# Altium schematic symbol library Analog Devices Data Converters Digital-to-Analog Converters.SchLib: 2231 symbols (part 112 of 135) (continued)
## AD9706BCPZ (continued)

## AD9706BCPZRL7
designator U?
Single 12-Bit TxDAC, -40 to +85 degC, CP-32-2, Pb-Free, Reel; Generic Part Number: AD9706; Manufacturer: Analog Devices; PartNumber: AD9706BCPZRL7; # DAC Outputs: 1; Max V+: 3.6V; Op Pwr Diss: 57mW; Resolution (Bits): 12; Settling Time: 11ns; Single Supply: Yes; DatasheetVersion: Rev.B; PackageVersion: Jan-2005; PackageReference: CP-32-2; PackageDescription: 32-Lead Lead Frame Chip Scale Package [LFCSP_VQ] 5 x 5 mm Body, Very Thin Quad; Supplier 1: Digi-Key; Supplier Part Number 1: AD9706BCPZRL7-ND; Supplier 2: Mouser; Supplier Part Number 2: 584-AD9706BCPZR7; Packing: Reel; RoHS: Y; Mounting Technology: Surface Mount; Code_JEDEC: MO-220-VHHD-2; ComponentLink1Description: Manufacturer URL; ComponentLink1URL: http://www.analog.com/en/index.html; ComponentLink2Description: Datasheet; ComponentLink2URL: http://www.analog.com/static/imported-files/data_sheets/AD9704_9705_9706_9707.pdf; ComponentLink3Description: Package Specification; ComponentLink3URL: http://www.analog.com/static/imported-files/packages/414143737956480539664569CP_32_2.pdf; ComponentLink4Description: Product URL; ComponentLink4URL: http://www.analog.com/en/digital-to-analog-converters/da-converters/ad9707/products/product.html
footprint CP-32-2_N (QFN, 32-Leads, Body 5x5mm, Pitch 0.5mm, Thermal Pad 3.1x3.1mm, IPC Medium Density)
footprint CP-32-2_L (QFN, 32-Leads, Body 5x5mm, Pitch 0.5mm, Thermal Pad 3.1x3.1mm, IPC High Density)
footprint CP-32-2_M (QFN, 32-Leads, Body 5x5mm, Pitch 0.5mm, Thermal Pad 3.1x3.1mm, IPC Low Density)
pins: 1 DB5 (in) "Data Bit 5.", 2 DB4 (in) "Data Bit 4.", 3 DVDD (power) "Digital Supply Voltage (1.7 V to 3.6 V).", 4 DB3 (in) "Data Bit 3.", 5 DB2 (in) "Data Bit 2.", 6 DB1 (in) "Data Bit 1.", 7 DB0 (LSB) (in) "Least Significant Data Bit (LSB).", 8 NC "No Connect.", 9 NC "No Connect.", 10 DCOM (power) "Digital Common.", 11 CLKVDD (power) "Clock Supply Voltage (1.7 V to 3.6 V).", 12 CLK+ (in) "Positive Differential Clock Input.", 13 CLK- (in) "Negative Differential Clock Input.", 14 CLKCOM (power) "Clock Common.", 15 CMODE/SCLK (in) "In pin mode, this pin selects the clock input type. Connect to CLKCOM for single-ended clock receiver (drive CLK+ and float CLK-). Connect to CLKVDD for differential receiver. In SPI mode, this pin is the serial data clock (See Datasheet)", 16 MODE/SDIO (io) "In pin mode, this pin selects the input data format. Connect to DCOM for straight binary, and DVDD for twos complement. In SPI mode, this pin acts as SPI data input/output.", 17 PIN/SPI/RESET (in) "Selects SPI Mode or Pin Mode Operation. Active high for pin mode operation, and active low for SPI mode operation. Pulse high to reset SPI registers to default values.", 18 AVDD (power) "Analog Supply Voltage (1.7 V to 3.6 V).", 19 OTCM (in) "Adjustable Output Common Mode. Refer to the Theory of Operation section for details.", 20 IOUTB (hiz) "Complementary DAC Current Output. Full-scale current is sourced when all data bits are 0s.", 21 IOUTA (hiz) "DAC Current Output. Full-scale current is sourced when all data bits are 1s.", 22 ACOM (power) "Analog Common.", 23 REFIO (io) "Reference Input/Output. Serves as reference input when internal reference disabled. Serves as 1.0 V reference output when internal reference is activated. Requires a 0.1 uF capacitor to ACOM when internal reference is (See Datasheet)", 24 FS ADJ (in) "Full-Scale Current Output Adjust.", 25 SLEEP/CSB (in) "In pin mode, active high powers down chip. In SPI mode, this pin is the serial port chip select (active low).", 26 DCOM (power) "Digital Common.", 27 DB11 (MSB) (in) "Most Significant Data Bit (MSB).", 28 DB10 (in) "Data Bit 10.", 29 DB9 (in) "Data Bit 9.", 30 DB8 (in) "Data Bit 8.", 31 DB7 (in) "Data Bit 7.", 32 DB6 (in) "Data Bit 6.", 33 EP (power) "It is recommended that the exposed pad be thermally connected to a copper ground plane for enhanced electrical and thermal performance."

## AD9707BCPZ
designator U?
Single 14-Bit TxDAC, -40 to +85 degC, CP-32-2, Pb-Free, Tray; Generic Part Number: AD9707; Manufacturer: Analog Devices; PartNumber: AD9707BCPZ; # DAC Outputs: 1; Max V+: 3.6V; Op Pwr Diss: 57mW; Resolution (Bits): 14; Settling Time: 11ns; Single Supply: Yes; DatasheetVersion: Rev.B; PackageVersion: Jan-2005; PackageReference: CP-32-2; PackageDescription: 32-Lead Lead Frame Chip Scale Package [LFCSP_VQ] 5 x 5 mm Body, Very Thin Quad; Supplier 1: Digi-Key; Supplier Part Number 1: AD9707BCPZ-ND; Supplier 2: Farnell; Supplier Part Number 2: 1438929; Supplier 3: Newark; Supplier Part Number 3: 25R4399; Supplier 4: Newark; Supplier Part Number 4: 28M4199; Supplier 5: Mouser; Supplier Part Number 5: 584-AD9707BCPZ; Packing: Tray; RoHS: Y; Mounting Technology: Surface Mount; Code_JEDEC: MO-220-VHHD-2; ComponentLink1Description: Manufacturer URL; ComponentLink1URL: http://www.analog.com/en/index.html; ComponentLink2Description: Datasheet; ComponentLink2URL: http://www.analog.com/static/imported-files/data_sheets/AD9704_9705_9706_9707.pdf; ComponentLink3Description: Package Specification; ComponentLink3URL: http://www.analog.com/static/imported-files/packages/414143737956480539664569CP_32_2.pdf; ComponentLink4Description: Product URL; ComponentLink4URL: http://www.analog.com/en/digital-to-analog-converters/da-converters/ad9707/products/product.html
footprint CP-32-2_N (QFN, 32-Leads, Body 5x5mm, Pitch 0.5mm, Thermal Pad 3.1x3.1mm, IPC Medium Density)
footprint CP-32-2_L (QFN, 32-Leads, Body 5x5mm, Pitch 0.5mm, Thermal Pad 3.1x3.1mm, IPC High Density)
footprint CP-32-2_M (QFN, 32-Leads, Body 5x5mm, Pitch 0.5mm, Thermal Pad 3.1x3.1mm, IPC Low Density)
pins: 1 DB7 (in) "Data Bit 7", 2 DB6 (in) "Data Bit 6", 3 DVDD (power) "Digital Supply Voltage (1.7 V to 3.6 V).", 4 DB5 (in) "Data Bit 5", 5 DB4 (in) "Data Bit 4", 6 DB3 (in) "Data Bit 3", 7 DB2 (in) "Data Bit 2", 8 DB1 (in) "Data Bit 1", 9 DB0 (LSB) (in) "Least Significant Data Bit (LSB).", 10 DCOM (power) "Digital Common.", 11 CLKVDD (power) "Clock Supply Voltage (1.7 V to 3.6 V).", 12 CLK+ (in) "Positive Differential Clock Input.", 13 CLK- (in) "Negative Differential Clock Input.", 14 CLKCOM (power) "Clock Common.", 15 CMODE/SCLK (in) "In pin mode, this pin selects the clock input type. Connect to CLKCOM for single-ended clock receiver (drive CLK+ and float CLK-). Connect to CLKVDD for differential receiver. In SPI mode, this pin is the serial data clock (See Datasheet)", 16 MODE/SDIO (io) "In pin mode, this pin selects the input data format. Connect to DCOM for straight binary, and DVDD for twos complement. In SPI mode, this pin acts as SPI data input/output.", 17 PIN/SPI/RESET (in) "Selects SPI Mode or Pin Mode Operation. Active high for pin mode operation and active low for SPI mode operation. Pulse high to reset SPI registers to default values.", 18 AVDD (power) "Analog Supply Voltage (1.7 V to 3.6 V).", 19 OTCM (in) "Adjustable Output Common Mode. Refer to the Theory of Operation section for details.", 20 IOUTB (out) "Complementary DAC Current Output. Full-scale current is sourced when all data bits are 0s.", 21 IOUTA (out) "DAC Current Output. Full-scale current is sourced when all data bits are 1s.", 22 ACOM (power) "Analog Common.", 23 REFIO (io) "Reference Input/Output. Serves as reference input when internal reference disabled. Serves as 1.0 V reference output when internal reference is activated. Requires a 0.1 uF capacitor to ACOM when internal reference is (See Datasheet)", 24 FSADJ (in) "Full-Scale Current Output Adjust.", 25 SLEEP/CSB (in) "In pin mode, active high powers down chip. In SPI mode, this pin is the serial port chip select (active low).", 26 DCOM (power) "Digital Common.", 27 DB13 (MSB) (in) "Most Significant Data Bit (MSB).", 28 DB12 (in) "Data Bit 12", 29 DB11 (in) "Data Bit 11", 30 DB10 (in) "Data Bit 10", 31 DB9 (in) "Data Bit 9", 32 DB8 (in) "Data Bit 8", 33 EP (power) "It is recommended that the exposed pad be thermally connected to a copper ground plane for enhanced electrical and thermal performance."

## AD9707BCPZRL
designator U?
Single 14-Bit TxDAC, -40 to +85 degC, CP-32-2, Pb-Free, Reel; Generic Part Number: AD9707; Manufacturer: Analog Devices; PartNumber: AD9707BCPZRL; # DAC Outputs: 1; Max V+: 3.6V; Op Pwr Diss: 57mW; Resolution (Bits): 14; Settling Time: 11ns; Single Supply: Yes; DatasheetVersion: Rev.B; PackageVersion: Jan-2005; PackageReference: CP-32-2; PackageDescription: 32-Lead Lead Frame Chip Scale Package [LFCSP_VQ] 5 x 5 mm Body, Very Thin Quad; Supplier 1: Mouser; Supplier Part Number 1: N/A; Packing: Reel; RoHS: Y; Mounting Technology: Surface Mount; Code_JEDEC: MO-220-VHHD-2; ComponentLink1Description: Manufacturer URL; ComponentLink1URL: http://www.analog.com/en/index.html; ComponentLink2Description: Datasheet; ComponentLink2URL: http://www.analog.com/static/imported-files/data_sheets/AD9704_9705_9706_9707.pdf; ComponentLink3Description: Package Specification; ComponentLink3URL: http://www.analog.com/static/imported-files/packages/414143737956480539664569CP_32_2.pdf; ComponentLink4Description: Product URL; ComponentLink4URL: http://www.analog.com/en/digital-to-analog-converters/da-converters/ad9707/products/product.html
footprint CP-32-2_N (QFN, 32-Leads, Body 5x5mm, Pitch 0.5mm, Thermal Pad 3.1x3.1mm, IPC Medium Density)
footprint CP-32-2_L (QFN, 32-Leads, Body 5x5mm, Pitch 0.5mm, Thermal Pad 3.1x3.1mm, IPC High Density)
footprint CP-32-2_M (QFN, 32-Leads, Body 5x5mm, Pitch 0.5mm, Thermal Pad 3.1x3.1mm, IPC Low Density)
pins: 1 DB7 (in) "Data Bit 7", 2 DB6 (in) "Data Bit 6", 3 DVDD (power) "Digital Supply Voltage (1.7 V to 3.6 V).", 4 DB5 (in) "Data Bit 5", 5 DB4 (in) "Data Bit 4", 6 DB3 (in) "Data Bit 3", 7 DB2 (in) "Data Bit 2", 8 DB1 (in) "Data Bit 1", 9 DB0 (LSB) (in) "Least Significant Data Bit (LSB).", 10 DCOM (power) "Digital Common.", 11 CLKVDD (power) "Clock Supply Voltage (1.7 V to 3.6 V).", 12 CLK+ (in) "Positive Differential Clock Input.", 13 CLK- (in) "Negative Differential Clock Input.", 14 CLKCOM (power) "Clock Common.", 15 CMODE/SCLK (in) "In pin mode, this pin selects the clock input type. Connect to CLKCOM for single-ended clock receiver (drive CLK+ and float CLK-). Connect to CLKVDD for differential receiver. In SPI mode, this pin is the serial data clock (See Datasheet)", 16 MODE/SDIO (io) "In pin mode, this pin selects the input data format. Connect to DCOM for straight binary, and DVDD for twos complement. In SPI mode, this pin acts as SPI data input/output.", 17 PIN/SPI/RESET (in) "Selects SPI Mode or Pin Mode Operation. Active high for pin mode operation and active low for SPI mode operation. Pulse high to reset SPI registers to default values.", 18 AVDD (power) "Analog Supply Voltage (1.7 V to 3.6 V).", 19 OTCM (in) "Adjustable Output Common Mode. Refer to the Theory of Operation section for details.", 20 IOUTB (out) "Complementary DAC Current Output. Full-scale current is sourced when all data bits are 0s.", 21 IOUTA (out) "DAC Current Output. Full-scale current is sourced when all data bits are 1s.", 22 ACOM (power) "Analog Common.", 23 REFIO (io) "Reference Input/Output. Serves as reference input when internal reference disabled. Serves as 1.0 V reference output when internal reference is activated. Requires a 0.1 uF capacitor to ACOM when internal reference is (See Datasheet)", 24 FSADJ (in) "Full-Scale Current Output Adjust.", 25 SLEEP/CSB (in) "In pin mode, active high powers down chip. In SPI mode, this pin is the serial port chip select (active low).", 26 DCOM (power) "Digital Common.", 27 DB13 (MSB) (in) "Most Significant Data Bit (MSB).", 28 DB12 (in) "Data Bit 12", 29 DB11 (in) "Data Bit 11", 30 DB10 (in) "Data Bit 10", 31 DB9 (in) "Data Bit 9", 32 DB8 (in) "Data Bit 8", 33 EP (power) "It is recommended that the exposed pad be thermally connected to a copper ground plane for enhanced electrical and thermal performance."

## AD9707BCPZRL7
designator U?
Single 14-Bit TxDAC, -40 to +85 degC, CP-32-2, Pb-Free, Reel; Generic Part Number: AD9707; Manufacturer: Analog Devices; PartNumber: AD9707BCPZRL7; # DAC Outputs: 1; Max V+: 3.6V; Op Pwr Diss: 57mW; Resolution (Bits): 14; Settling Time: 11ns; Single Supply: Yes; DatasheetVersion: Rev.B; PackageVersion: Jan-2005; PackageReference: CP-32-2; PackageDescription: 32-Lead Lead Frame Chip Scale Package [LFCSP_VQ] 5 x 5 mm Body, Very Thin Quad; Supplier 1: Digi-Key; Supplier Part Number 1: AD9707BCPZRL7-ND; Supplier 2: Newark; Supplier Part Number 2: 28M4200; Supplier 3: Mouser; Supplier Part Number 3: 584-AD9707BCPZR7; Packing: Reel; RoHS: Y; Mounting Technology: Surface Mount; Code_JEDEC: MO-220-VHHD-2; ComponentLink1Description: Manufacturer URL; ComponentLink1URL: http://www.analog.com/en/index.html; ComponentLink2Description: Datasheet; ComponentLink2URL: http://www.analog.com/static/imported-files/data_sheets/AD9704_9705_9706_9707.pdf; ComponentLink3Description: Package Specification; ComponentLink3URL: http://www.analog.com/static/imported-files/packages/414143737956480539664569CP_32_2.pdf; ComponentLink4Description: Product URL; ComponentLink4URL: http://www.analog.com/en/digital-to-analog-converters/da-converters/ad9707/products/product.html
footprint CP-32-2_N (QFN, 32-Leads, Body 5x5mm, Pitch 0.5mm, Thermal Pad 3.1x3.1mm, IPC Medium Density)
footprint CP-32-2_L (QFN, 32-Leads, Body 5x5mm, Pitch 0.5mm, Thermal Pad 3.1x3.1mm, IPC High Density)
footprint CP-32-2_M (QFN, 32-Leads, Body 5x5mm, Pitch 0.5mm, Thermal Pad 3.1x3.1mm, IPC Low Density)
pins: 1 DB7 (in) "Data Bit 7", 2 DB6 (in) "Data Bit 6", 3 DVDD (power) "Digital Supply Voltage (1.7 V to 3.6 V).", 4 DB5 (in) "Data Bit 5", 5 DB4 (in) "Data Bit 4", 6 DB3 (in) "Data Bit 3", 7 DB2 (in) "Data Bit 2", 8 DB1 (in) "Data Bit 1", 9 DB0 (LSB) (in) "Least Significant Data Bit (LSB).", 10 DCOM (power) "Digital Common.", 11 CLKVDD (power) "Clock Supply Voltage (1.7 V to 3.6 V).", 12 CLK+ (in) "Positive Differential Clock Input.", 13 CLK- (in) "Negative Differential Clock Input.", 14 CLKCOM (power) "Clock Common.", 15 CMODE/SCLK (in) "In pin mode, this pin selects the clock input type. Connect to CLKCOM for single-ended clock receiver (drive CLK+ and float CLK-). Connect to CLKVDD for differential receiver. In SPI mode, this pin is the serial data clock (See Datasheet)", 16 MODE/SDIO (io) "In pin mode, this pin selects the input data format. Connect to DCOM for straight binary, and DVDD for twos complement. In SPI mode, this pin acts as SPI data input/output.", 17 PIN/SPI/RESET (in) "Selects SPI Mode or Pin Mode Operation. Active high for pin mode operation and active low for SPI mode operation. Pulse high to reset SPI registers to default values.", 18 AVDD (power) "Analog Supply Voltage (1.7 V to 3.6 V).", 19 OTCM (in) "Adjustable Output Common Mode. Refer to the Theory of Operation section for details.", 20 IOUTB (out) "Complementary DAC Current Output. Full-scale current is sourced when all data bits are 0s.", 21 IOUTA (out) "DAC Current Output. Full-scale current is sourced when all data bits are 1s.", 22 ACOM (power) "Analog Common.", 23 REFIO (io) "Reference Input/Output. Serves as reference input when internal reference disabled. Serves as 1.0 V reference output when internal reference is activated. Requires a 0.1 uF capacitor to ACOM when internal reference is (See Datasheet)", 24 FSADJ (in) "Full-Scale Current Output Adjust.", 25 SLEEP/CSB (in) "In pin mode, active high powers down chip. In SPI mode, this pin is the serial port chip select (active low).", 26 DCOM (power) "Digital Common.", 27 DB13 (MSB) (in) "Most Significant Data Bit (MSB).", 28 DB12 (in) "Data Bit 12", 29 DB11 (in) "Data Bit 11", 30 DB10 (in) "Data Bit 10", 31 DB9 (in) "Data Bit 9", 32 DB8 (in) "Data Bit 8", 33 EP (power) "It is recommended that the exposed pad be thermally connected to a copper ground plane for enhanced electrical and thermal performance."

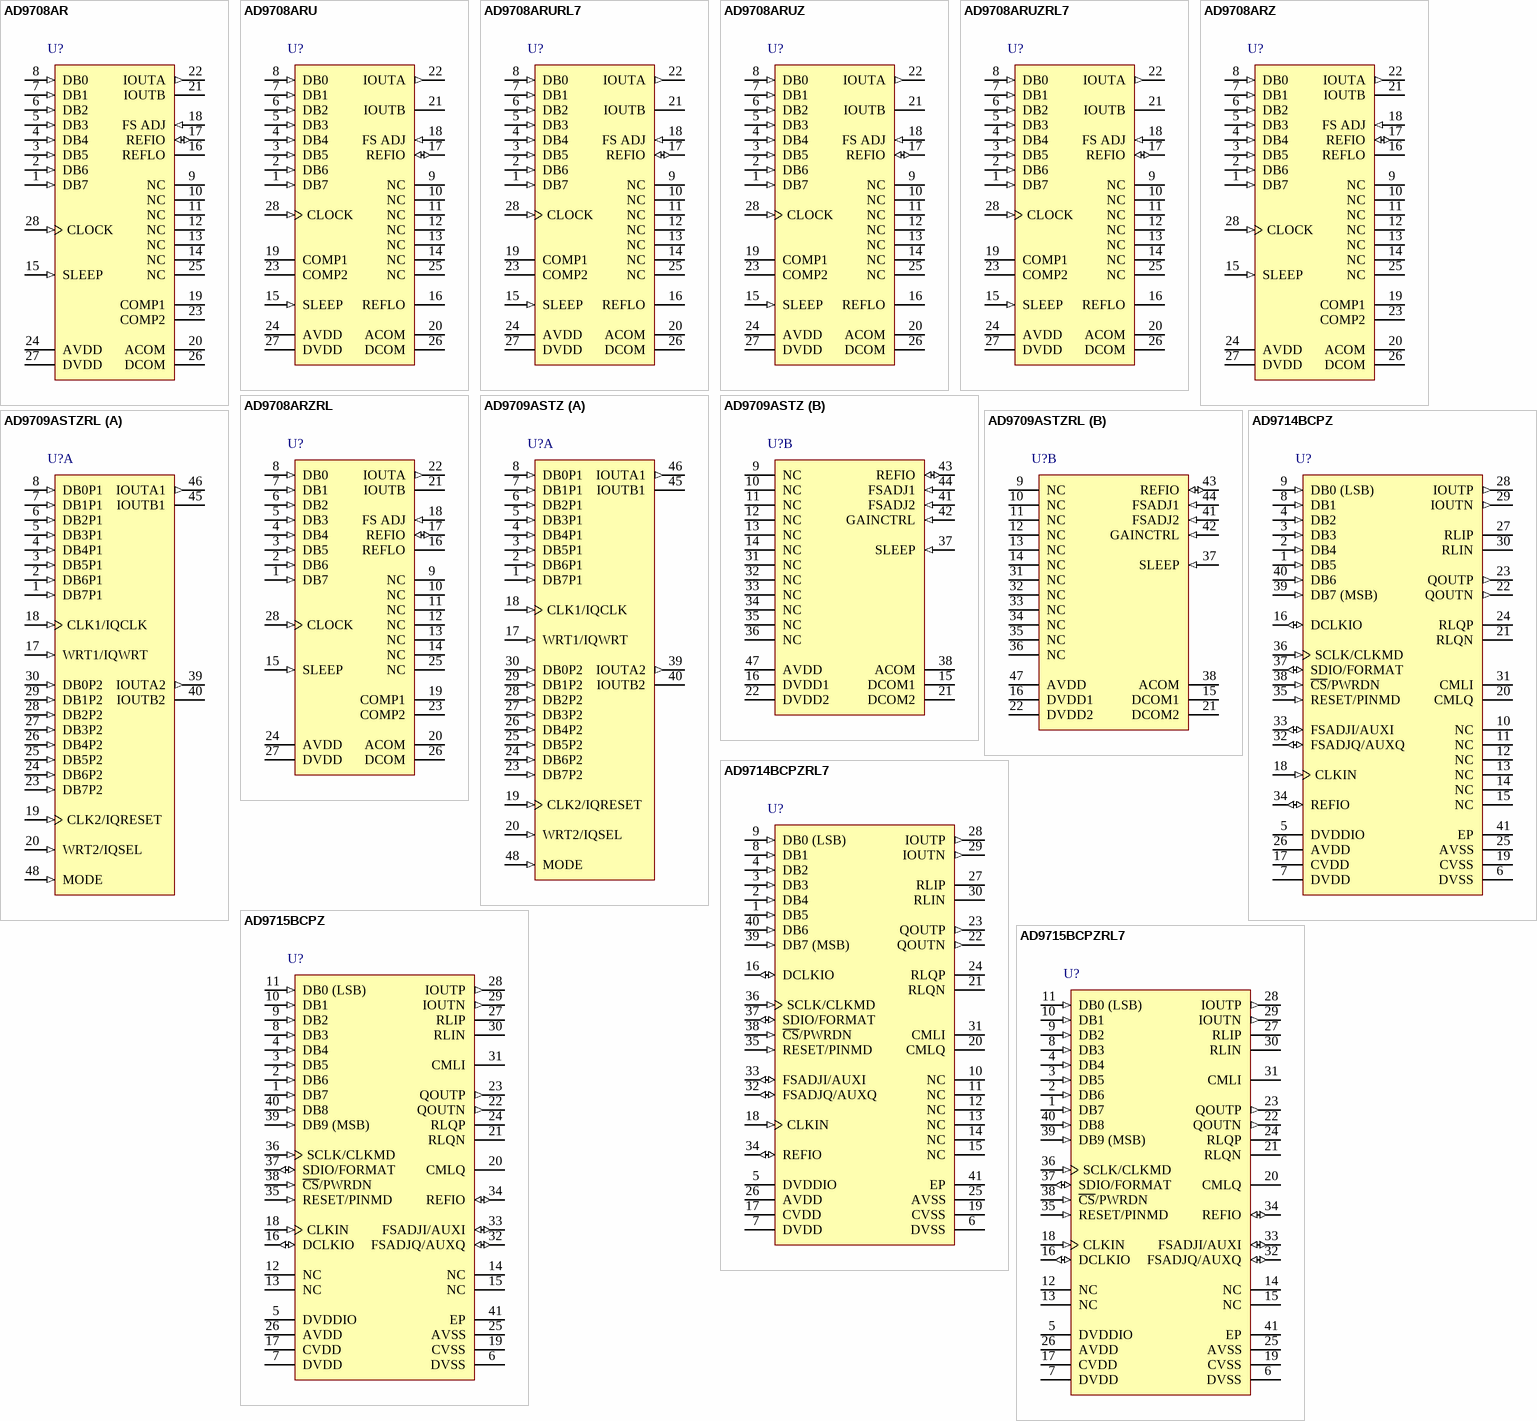
[diagram p87: symbols AD9708AR to AD9715BCPZRL7]

## AD9708AR
designator U?
Single 8-Bit TxDAC, 100 Msps, -40 to +85 degC, RW-28, Tube; Generic Part Number: AD9708; Manufacturer: Analog Devices; PartNumber: AD9708AR; # DAC Outputs: 1; Max V+: 5.5V; Op Pwr Diss: 175mW; Resolution (Bits): 8; Settling Time: 35ns; Single Supply: Yes; DatasheetVersion: Rev.B; PackageVersion: 060706-A; PackageReference: RW-28; PackageDescription: 28-Lead Standard Small Outline Package [SOIC_W]; Supplier 1: Digi-Key; Supplier Part Number 1: AD9708AR-ND; Supplier 2: Mouser; Supplier Part Number 2: 584-AD9708AR; Packing: Tube; RoHS: N; Mounting Technology: Surface Mount; Code_JEDEC: MS-013-AE; ComponentLink1Description: Manufacturer URL; ComponentLink1URL: http://www.analog.com/en/index.html; ComponentLink2Description: Datasheet; ComponentLink2URL: http://www.analog.com/static/imported-files/data_sheets/AD9708.pdf; ComponentLink3Description: Product URL; ComponentLink3URL: http://www.analog.com/en/digital-to-analog-converters/da-converters/ad9708/products/product.html
footprint RW-28_N (SOIC, 28-Leads, Body 17.9x7.5mm, Pitch 1.27mm, IPC Medium Density)
footprint RW-28_L (SOIC, 28-Leads, Body 17.9x7.5mm, Pitch 1.27mm, IPC High Density)
footprint RW-28_M (SOIC, 28-Leads, Body 17.9x7.5mm, Pitch 1.27mm, IPC Low Density)
pins: 1 DB7 (in) "Most Significant Data Bit (MSB).", 2 DB6 (in) "Data Bit 6.", 3 DB5 (in) "Data Bit 5.", 4 DB4 (in) "Data Bit 4.", 5 DB3 (in) "Data Bit 3.", 6 DB2 (in) "Data Bit 2.", 7 DB1 (in) "Data Bit 1.", 8 DB0 (in) "Least Significant Data Bit (LSB).", 9 NC "No Internal Connection.", 10 NC "No Internal Connection.", 11 NC "No Internal Connection.", 12 NC "No Internal Connection.", 13 NC "No Internal Connection.", 14 NC "No Internal Connection.", 15 SLEEP (in) "Power-Down Control Input.  Active High.  Contains active pull-down circuit, thus may be left unterminated if not used.", 16 REFLO "Reference Ground when Internal 1.2 V Reference Used.  Connect to AVDD to disable internal reference.", 17 REFIO (io) "Reference Input/Output.  Serves as reference input when internal reference disabled (i.e., Tie REFLO to AVDD). Serves as 1.2 V reference output when internal reference activated (i.e., Tie REFLO to ACOM).  Requires 0.1 uF (See Datasheet)", 18 FS ADJ (in) "Full-Scale Current Output Adjust.", 19 COMP1 "Bandwidth/Noise Reduction Node. Add 0.1 uF to AVDD for optimum performance.", 20 ACOM (power) "Analog Common.", 21 IOUTB "Complementary DAC Current Output. Full-scale current when all data bits are 0s.", 22 IOUTA (out) "DAC Current Output. Full-scale current when all data bits are 1s.", 23 COMP2 "Internal Bias Node for Switch Driver Circuitry.  Decouple to ACOM with 0.1 uF capacitor.", 24 AVDD (power) "Analog Supply Voltage (+2.7 V to +5.5 V).", 25 NC "No Internal Connection.", 26 DCOM (power) "Digital Common.", 27 DVDD (power) "Digital Supply Voltage (+2.7 V to +5.5 V).", 28 CLOCK (in) "Clock Input.  Data latched on positive edge of clock."

## AD9708ARU
designator U?
Single 8-Bit TxDAC, 100 Msps, -40 to +85 degC, RU-28, Tube; Generic Part Number: AD9708; Manufacturer: Analog Devices; PartNumber: AD9708ARU; # DAC Outputs: 1; Max V+: 5.5V; Op Pwr Diss: 175mW; Resolution (Bits): 8; Settling Time: 35ns; Single Supply: Yes; DatasheetVersion: Rev.B; PackageVersion: 2005; PackageReference: RU-28; PackageDescription: 28-Lead Thin Shrink Small Outline Package [TSSOP]; Supplier 1: Digi-Key; Supplier Part Number 1: AD9708ARU-ND; Supplier 2: Mouser; Supplier Part Number 2: 584-AD9708ARU; Packing: Tube; RoHS: N; Mounting Technology: Surface Mount; Code_JEDEC: MO-153-AE; ComponentLink1Description: Manufacturer URL; ComponentLink1URL: http://www.analog.com/en/index.html; ComponentLink2Description: Datasheet; ComponentLink2URL: http://www.analog.com/static/imported-files/data_sheets/AD9708.pdf; ComponentLink3Description: Package Specification; ComponentLink3URL: http://www.analog.com/static/imported-files/packages/249854663RU_28.pdf; ComponentLink4Description: Product URL; ComponentLink4URL: http://www.analog.com/en/digital-to-analog-converters/da-converters/ad9708/products/product.html
footprint RU-28_N (TSOP, 28-Leads, Body 9.7x4.4mm, Pitch 0.65mm, IPC Medium Density)
footprint RU-28_L (TSOP, 28-Leads, Body 9.7x4.4mm, Pitch 0.65mm, IPC High Density)
footprint RU-28_M (TSOP, 28-Leads, Body 9.7x4.4mm, Pitch 0.65mm, IPC Low Density)
pins: 1 DB7 (in) "Most Significant Data Bit (MSB).", 2 DB6 (in) "Data Bit 6", 3 DB5 (in) "Data Bit 5", 4 DB4 (in) "Data Bit 4", 5 DB3 (in) "Data Bit 3", 6 DB2 (in) "Data Bit 2", 7 DB1 (in) "Data Bit 1", 8 DB0 (in) "Least Significant Data Bit (LSB).", 9 NC "No Internal Connection.", 10 NC "No Internal Connection.", 11 NC "No Internal Connection.", 12 NC "No Internal Connection.", 13 NC "No Internal Connection.", 14 NC "No Internal Connection.", 15 SLEEP (in) "Power-Down Control Input.  Active High.  Contains active pull-down circuit, thus may be left unterminated if not used.", 16 REFLO "Reference Ground when Internal 1.2 V Reference Used.  Connect to AVDD to disable internal reference.", 17 REFIO (io) "Reference Input/Output.  Serves as reference input when internal reference disabled (i.e., Tie REFLO to AVDD). Serves as 1.2 V reference output when internal reference activated (i.e., Tie REFLO to ACOM).  Requires 0.1 uF (See Datasheet)", 18 FS ADJ (in) "Full-Scale Current Output Adjust.", 19 COMP1 "Bandwidth/Noise Reduction Node. Add 0.1 uF to AVDD for optimum performance.", 20 ACOM (power) "Analog Common.", 21 IOUTB "Complementary DAC Current Output. Full-scale current when all data bits are 0s.", 22 IOUTA (out) "DAC Current Output. Full-scale current when all data bits are 1s.", 23 COMP2 "Internal Bias Node for Switch Driver Circuitry.  Decouple to ACOM with 0.1 uF capacitor.", 24 AVDD (power) "Analog Supply Voltage (+2.7 V to +5.5 V).", 25 NC "No Internal Connection.", 26 DCOM (power) "Digital Common.", 27 DVDD (power) "Digital Supply Voltage (+2.7 V to +5.5 V).", 28 CLOCK (in) "Clock Input.  Data latched on positive edge of clock."

## AD9708ARURL7
designator U?
Single 8-Bit TxDAC, 100 Msps, -40 to +85 degC, RU-28, Reel; Generic Part Number: AD9708; Manufacturer: Analog Devices; PartNumber: AD9708ARURL7; # DAC Outputs: 1; Max V+: 5.5V; Op Pwr Diss: 175mW; Resolution (Bits): 8; Settling Time: 35ns; Single Supply: Yes; DatasheetVersion: Rev.B; PackageVersion: 2005; PackageReference: RU-28; PackageDescription: 28-Lead Thin Shrink Small Outline Package [TSSOP]; Supplier 1: Digi-Key; Supplier Part Number 1: AD9708ARURL7-ND; Supplier 2: Mouser; Supplier Part Number 2: 584-AD9708ARUR7; Packing: Reel; RoHS: N; Mounting Technology: Surface Mount; Code_JEDEC: MO-153-AE; ComponentLink1Description: Manufacturer URL; ComponentLink1URL: http://www.analog.com/en/index.html; ComponentLink2Description: Datasheet; ComponentLink2URL: http://www.analog.com/static/imported-files/data_sheets/AD9708.pdf; ComponentLink3Description: Package Specification; ComponentLink3URL: http://www.analog.com/static/imported-files/packages/249854663RU_28.pdf; ComponentLink4Description: Product URL; ComponentLink4URL: http://www.analog.com/en/digital-to-analog-converters/da-converters/ad9708/products/product.html
footprint RU-28_N (TSOP, 28-Leads, Body 9.7x4.4mm, Pitch 0.65mm, IPC Medium Density)
footprint RU-28_L (TSOP, 28-Leads, Body 9.7x4.4mm, Pitch 0.65mm, IPC High Density)
footprint RU-28_M (TSOP, 28-Leads, Body 9.7x4.4mm, Pitch 0.65mm, IPC Low Density)
pins: 1 DB7 (in) "Most Significant Data Bit (MSB).", 2 DB6 (in) "Data Bit 6", 3 DB5 (in) "Data Bit 5", 4 DB4 (in) "Data Bit 4", 5 DB3 (in) "Data Bit 3", 6 DB2 (in) "Data Bit 2", 7 DB1 (in) "Data Bit 1", 8 DB0 (in) "Least Significant Data Bit (LSB).", 9 NC "No Internal Connection.", 10 NC "No Internal Connection.", 11 NC "No Internal Connection.", 12 NC "No Internal Connection.", 13 NC "No Internal Connection.", 14 NC "No Internal Connection.", 15 SLEEP (in) "Power-Down Control Input.  Active High.  Contains active pull-down circuit, thus may be left unterminated if not used.", 16 REFLO "Reference Ground when Internal 1.2 V Reference Used.  Connect to AVDD to disable internal reference.", 17 REFIO (io) "Reference Input/Output.  Serves as reference input when internal reference disabled (i.e., Tie REFLO to AVDD). Serves as 1.2 V reference output when internal reference activated (i.e., Tie REFLO to ACOM).  Requires 0.1 uF (See Datasheet)", 18 FS ADJ (in) "Full-Scale Current Output Adjust.", 19 COMP1 "Bandwidth/Noise Reduction Node. Add 0.1 uF to AVDD for optimum performance.", 20 ACOM (power) "Analog Common.", 21 IOUTB "Complementary DAC Current Output. Full-scale current when all data bits are 0s.", 22 IOUTA (out) "DAC Current Output. Full-scale current when all data bits are 1s.", 23 COMP2 "Internal Bias Node for Switch Driver Circuitry.  Decouple to ACOM with 0.1 uF capacitor.", 24 AVDD (power) "Analog Supply Voltage (+2.7 V to +5.5 V).", 25 NC "No Internal Connection.", 26 DCOM (power) "Digital Common.", 27 DVDD (power) "Digital Supply Voltage (+2.7 V to +5.5 V).", 28 CLOCK (in) "Clock Input.  Data latched on positive edge of clock."

## AD9708ARUZ
designator U?
Single 8-Bit TxDAC, 100 Msps, -40 to +85 degC, RU-28, Pb-Free, Tube; Generic Part Number: AD9708; Manufacturer: Analog Devices; PartNumber: AD9708ARUZ; # DAC Outputs: 1; Max V+: 5.5V; Op Pwr Diss: 175mW; Resolution (Bits): 8; Settling Time: 35ns; Single Supply: Yes; DatasheetVersion: Rev.B; PackageVersion: 2005; PackageReference: RU-28; PackageDescription: 28-Lead Thin Shrink Small Outline Package [TSSOP]; Supplier 1: Digi-Key; Supplier Part Number 1: AD9708ARUZ-ND; Supplier 2: Farnell; Supplier Part Number 2: 2305696; Supplier 3: Newark; Supplier Part Number 3: 84W7488; Supplier 4: Newark; Supplier Part Number 4: 19M8944; Supplier 5: Mouser; Supplier Part Number 5: 584-AD9708ARUZ; Packing: Tube; RoHS: Y; Mounting Technology: Surface Mount; Code_JEDEC: MO-153-AE; ComponentLink1Description: Manufacturer URL; ComponentLink1URL: http://www.analog.com/en/index.html; ComponentLink2Description: Datasheet; ComponentLink2URL: http://www.analog.com/static/imported-files/data_sheets/AD9708.pdf; ComponentLink3Description: Package Specification; ComponentLink3URL: http://www.analog.com/static/imported-files/packages/249854663RU_28.pdf; ComponentLink4Description: Product URL; ComponentLink4URL: http://www.analog.com/en/digital-to-analog-converters/da-converters/ad9708/products/product.html
footprint RU-28_N (TSOP, 28-Leads, Body 9.7x4.4mm, Pitch 0.65mm, IPC Medium Density)
footprint RU-28_L (TSOP, 28-Leads, Body 9.7x4.4mm, Pitch 0.65mm, IPC High Density)
footprint RU-28_M (TSOP, 28-Leads, Body 9.7x4.4mm, Pitch 0.65mm, IPC Low Density)
pins: 1 DB7 (in) "Most Significant Data Bit (MSB).", 2 DB6 (in) "Data Bit 6", 3 DB5 (in) "Data Bit 5", 4 DB4 (in) "Data Bit 4", 5 DB3 (in) "Data Bit 3", 6 DB2 (in) "Data Bit 2", 7 DB1 (in) "Data Bit 1", 8 DB0 (in) "Least Significant Data Bit (LSB).", 9 NC "No Internal Connection.", 10 NC "No Internal Connection.", 11 NC "No Internal Connection.", 12 NC "No Internal Connection.", 13 NC "No Internal Connection.", 14 NC "No Internal Connection.", 15 SLEEP (in) "Power-Down Control Input.  Active High.  Contains active pull-down circuit, thus may be left unterminated if not used.", 16 REFLO "Reference Ground when Internal 1.2 V Reference Used.  Connect to AVDD to disable internal reference.", 17 REFIO (io) "Reference Input/Output.  Serves as reference input when internal reference disabled (i.e., Tie REFLO to AVDD). Serves as 1.2 V reference output when internal reference activated (i.e., Tie REFLO to ACOM).  Requires 0.1 uF (See Datasheet)", 18 FS ADJ (in) "Full-Scale Current Output Adjust.", 19 COMP1 "Bandwidth/Noise Reduction Node. Add 0.1 uF to AVDD for optimum performance.", 20 ACOM (power) "Analog Common.", 21 IOUTB "Complementary DAC Current Output. Full-scale current when all data bits are 0s.", 22 IOUTA (out) "DAC Current Output. Full-scale current when all data bits are 1s.", 23 COMP2 "Internal Bias Node for Switch Driver Circuitry.  Decouple to ACOM with 0.1 uF capacitor.", 24 AVDD (power) "Analog Supply Voltage (+2.7 V to +5.5 V).", 25 NC "No Internal Connection.", 26 DCOM (power) "Digital Common.", 27 DVDD (power) "Digital Supply Voltage (+2.7 V to +5.5 V).", 28 CLOCK (in) "Clock Input.  Data latched on positive edge of clock."

## AD9708ARUZRL7
designator U?
Single 8-Bit TxDAC, 100 Msps, -40 to +85 degC, RU-28, Pb-Free, Reel; Generic Part Number: AD9708; Manufacturer: Analog Devices; PartNumber: AD9708ARUZRL7; # DAC Outputs: 1; Max V+: 5.5V; Op Pwr Diss: 175mW; Resolution (Bits): 8; Settling Time: 35ns; Single Supply: Yes; DatasheetVersion: Rev.B; PackageVersion: 2005; PackageReference: RU-28; PackageDescription: 28-Lead Thin Shrink Small Outline Package [TSSOP]; Supplier 1: Digi-Key; Supplier Part Number 1: AD9708ARUZRL7-ND; Supplier 2: Mouser; Supplier Part Number 2: 584-AD9708ARUZR7; Packing: Reel; RoHS: Y; Mounting Technology: Surface Mount; Code_JEDEC: MO-153-AE; ComponentLink1Description: Manufacturer URL; ComponentLink1URL: http://www.analog.com/en/index.html; ComponentLink2Description: Datasheet; ComponentLink2URL: http://www.analog.com/static/imported-files/data_sheets/AD9708.pdf; ComponentLink3Description: Package Specification; ComponentLink3URL: http://www.analog.com/static/imported-files/packages/249854663RU_28.pdf; ComponentLink4Description: Product URL; ComponentLink4URL: http://www.analog.com/en/digital-to-analog-converters/da-converters/ad9708/products/product.html
footprint RU-28_N (TSOP, 28-Leads, Body 9.7x4.4mm, Pitch 0.65mm, IPC Medium Density)
footprint RU-28_L (TSOP, 28-Leads, Body 9.7x4.4mm, Pitch 0.65mm, IPC High Density)
footprint RU-28_M (TSOP, 28-Leads, Body 9.7x4.4mm, Pitch 0.65mm, IPC Low Density)
pins: 1 DB7 (in) "Most Significant Data Bit (MSB).", 2 DB6 (in) "Data Bit 6", 3 DB5 (in) "Data Bit 5", 4 DB4 (in) "Data Bit 4", 5 DB3 (in) "Data Bit 3", 6 DB2 (in) "Data Bit 2", 7 DB1 (in) "Data Bit 1", 8 DB0 (in) "Least Significant Data Bit (LSB).", 9 NC "No Internal Connection.", 10 NC "No Internal Connection.", 11 NC "No Internal Connection.", 12 NC "No Internal Connection.", 13 NC "No Internal Connection.", 14 NC "No Internal Connection.", 15 SLEEP (in) "Power-Down Control Input.  Active High.  Contains active pull-down circuit, thus may be left unterminated if not used.", 16 REFLO "Reference Ground when Internal 1.2 V Reference Used.  Connect to AVDD to disable internal reference.", 17 REFIO (io) "Reference Input/Output.  Serves as reference input when internal reference disabled (i.e., Tie REFLO to AVDD). Serves as 1.2 V reference output when internal reference activated (i.e., Tie REFLO to ACOM).  Requires 0.1 uF (See Datasheet)", 18 FS ADJ (in) "Full-Scale Current Output Adjust.", 19 COMP1 "Bandwidth/Noise Reduction Node. Add 0.1 uF to AVDD for optimum performance.", 20 ACOM (power) "Analog Common.", 21 IOUTB "Complementary DAC Current Output. Full-scale current when all data bits are 0s.", 22 IOUTA (out) "DAC Current Output. Full-scale current when all data bits are 1s.", 23 COMP2 "Internal Bias Node for Switch Driver Circuitry.  Decouple to ACOM with 0.1 uF capacitor.", 24 AVDD (power) "Analog Supply Voltage (+2.7 V to +5.5 V).", 25 NC "No Internal Connection.", 26 DCOM (power) "Digital Common.", 27 DVDD (power) "Digital Supply Voltage (+2.7 V to +5.5 V).", 28 CLOCK (in) "Clock Input.  Data latched on positive edge of clock."